# Altium footprint library Connectors_THT.PcbLib: 103 footprints (part 9 of 11)
Each footprint in its own frame and in the unit in brackets; x right, y up, seen from the top. Pads: shape width x height; smd on the part's side, far side on the other; paste and mask are expansions set on the pad; w line width, h text height; cw(c..) or ccw(c..) is an arc to the next point about the centre after c.
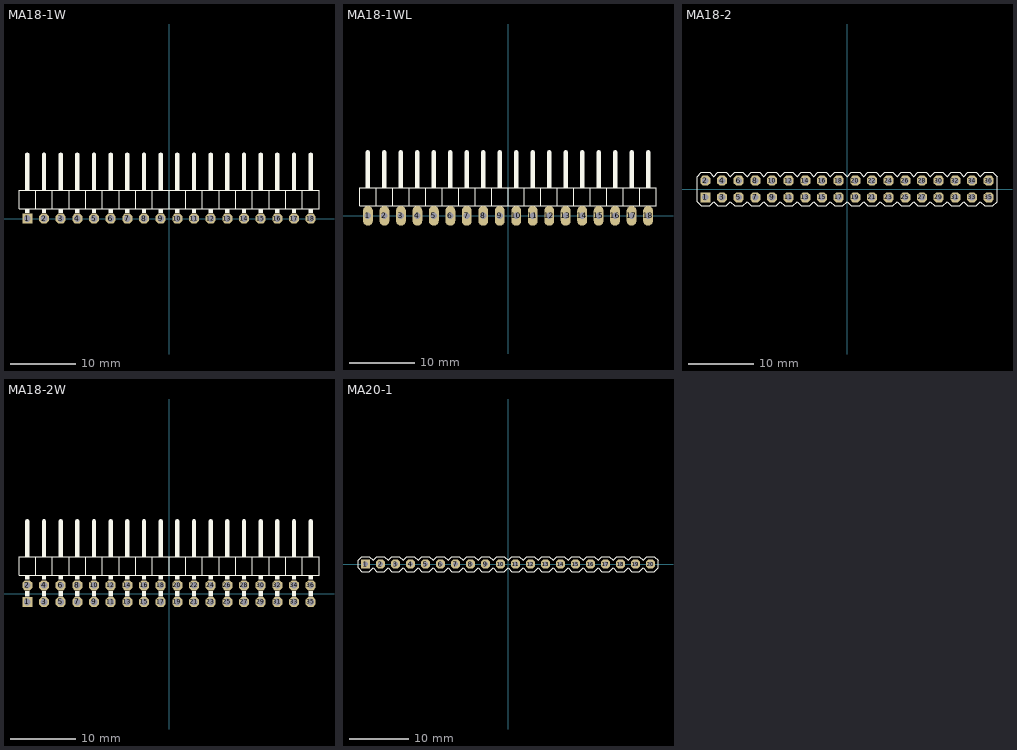
[diagram p8: the footprints below, top view; thin cyan lines are the x and y axes]

## MA18-1W [mil]
pads (18):
  rect 60x60 hole 40: 1(-850,0)
  oct 60x60 hole 40: 2(-750,0) 3(-650,0) 4(-550,0) 5(-450,0) 6(-350,0) 7(-250,0) 8(-150,0) 9(-50,0) 10(50,0) 11(150,0) 12(250,0) 13(350,0) 14(450,0) 15(550,0) 16(650,0) 17(750,0) 18(850,0)
Top Overlay:
  rectangle: 637,170 663,200
  rectangle: 737,170 763,200
  rectangle: 837,170 863,200
  rectangle: 137,170 163,200
  rectangle: 237,170 263,200
  rectangle: 337,170 363,200
  rectangle: 437,170 463,200
  rectangle: 537,170 563,200
  rectangle: -363,170 -337,200
  rectangle: -263,170 -237,200
  rectangle: -163,170 -137,200
  rectangle: -63,170 -37,200
  rectangle: 37,170 63,200
  rectangle: -863,170 -837,200
  rectangle: -763,170 -737,200
  rectangle: -663,170 -637,200
  rectangle: -563,170 -537,200
  rectangle: -463,170 -437,200
  rectangle: 737,34 763,60
  rectangle: 837,34 863,60
  rectangle: 637,34 663,60
  rectangle: 537,34 563,60
  rectangle: 437,34 463,60
  rectangle: 337,34 363,60
  rectangle: 237,34 263,60
  rectangle: 137,34 163,60
  rectangle: 37,34 63,60
  rectangle: -63,34 -37,60
  rectangle: -163,34 -137,60
  rectangle: -263,34 -237,60
  rectangle: -363,34 -337,60
  rectangle: -463,34 -437,60
  rectangle: -563,34 -537,60
  rectangle: -663,34 -637,60
  rectangle: -763,34 -737,60
  rectangle: -863,34 -837,60
  lines w6: -800,60 -800,170 ; -800,60 -900,60 -900,170 -800,170 ; -800,60 -700,60 ; -800,170 -700,170 ; -700,60 -600,60 ; -700,60 -700,170 ; -700,170 -600,170 ; -600,60 -500,60 ; -600,60 -600,170 ; -600,170 -500,170 ; -500,60 -400,60 ; -500,60 -500,170 ; -500,170 -400,170 ; -400,60 -300,60 ; -400,60 -400,170 ; -400,170 -300,170 ; -300,60 -300,170 ; -300,60 -200,60 ; -300,170 -200,170 ; -200,60 -100,60 ; -200,60 -200,170 ; -200,170 -100,170 ; -100,60 0,60 ; -100,60 -100,170 ; -100,170 0,170 ; 0,60 100,60 ; 0,60 0,170 ; 0,170 100,170 ; 100,60 200,60 ; 100,60 100,170 ; 100,170 200,170 ; 200,60 200,170 ; 200,60 300,60 ; 200,170 300,170 ; 300,60 400,60 ; 300,60 300,170 ; 300,170 400,170 ; 400,60 500,60 ; 400,60 400,170 ; 400,170 500,170 ; 500,60 600,60 ; 500,60 500,170 ; 500,170 600,170 ; 600,60 700,60 ; 600,60 600,170 ; 600,170 700,170 ; 700,60 700,170 ; 700,60 800,60 ; 700,170 800,170 ; 800,60 900,60 900,170 800,170 ; 800,60 800,170
  lines w26: -850,200 -850,385 ; -750,200 -750,385 ; -650,200 -650,385 ; -550,200 -550,385 ; -450,200 -450,385 ; -350,200 -350,385 ; -250,200 -250,385 ; -150,200 -150,385 ; -50,200 -50,385 ; 50,200 50,385 ; 150,200 150,385 ; 250,200 250,385 ; 350,200 350,385 ; 450,200 450,385 ; 550,200 550,385 ; 650,200 650,385 ; 750,200 750,385 ; 850,200 850,385
3D body: height 62.48, standoff 0, extent 837.51,-12.49 862.51,12.51
3D body: height 100, standoff 0, extent 800,60 900,170
3D body: height 62.5, standoff 37.5, extent 837.51,-12.49 862.51,393.76
3D body: height 62.48, standoff 0, extent 737.51,-12.49 762.51,12.51
3D body: height 100, standoff 0, extent 700,60 800,170
3D body: height 62.5, standoff 37.5, extent 737.51,-12.49 762.51,393.76
3D body: height 62.5, standoff 37.5, extent 637.5,-12.49 662.5,393.75
3D body: height 100, standoff 0, extent 600,60 700,170
3D body: height 62.48, standoff 0, extent 637.51,-12.49 662.51,12.51
3D body: height 31.5, standoff 0, extent 637.51,-12.49 662.51,12.51
3D body: height 31.5, standoff 0, extent 737.51,-12.49 762.51,12.51
3D body: height 31.5, standoff 0, extent 837.51,-12.49 862.51,12.51
3D body: height 62.48, standoff 0, extent 537.51,-12.49 562.51,12.51
3D body: height 100, standoff 0, extent 500,60 600,170
3D body: height 62.5, standoff 37.5, extent 537.51,-12.49 562.51,393.76
3D body: height 62.48, standoff 0, extent 437.51,-12.49 462.51,12.51
3D body: height 100, standoff 0, extent 400,60 500,170
3D body: height 62.5, standoff 37.5, extent 437.51,-12.49 462.51,393.76
3D body: height 62.48, standoff 0, extent 337.51,-12.49 362.51,12.51
3D body: height 100, standoff 0, extent 300,60 400,170
3D body: height 62.5, standoff 37.5, extent 337.51,-12.49 362.51,393.76
3D body: height 62.48, standoff 0, extent 237.51,-12.49 262.51,12.51
3D body: height 100, standoff 0, extent 200,60 300,170
3D body: height 62.5, standoff 37.5, extent 237.51,-12.49 262.51,393.76
3D body: height 62.5, standoff 37.5, extent 137.5,-12.49 162.5,393.75
3D body: height 100, standoff 0, extent 100,60 200,170
3D body: height 62.48, standoff 0, extent 137.51,-12.49 162.51,12.51
3D body: height 31.5, standoff 0, extent 137.51,-12.49 162.51,12.51
3D body: height 31.5, standoff 0, extent 237.51,-12.49 262.51,12.51
3D body: height 31.5, standoff 0, extent 337.51,-12.49 362.51,12.51
3D body: height 31.5, standoff 0, extent 437.51,-12.49 462.51,12.51
3D body: height 31.5, standoff 0, extent 537.51,-12.49 562.51,12.51
3D body: height 62.48, standoff 0, extent 37.51,-12.49 62.51,12.51
3D body: height 100, standoff 0, extent 0,60 100,170
3D body: height 62.5, standoff 37.5, extent 37.51,-12.49 62.51,393.76
3D body: height 62.48, standoff 0, extent -62.49,-12.49 -37.49,12.51
3D body: height 100, standoff 0, extent -100,60 0,170
3D body: height 62.5, standoff 37.5, extent -62.49,-12.49 -37.49,393.76
3D body: height 62.48, standoff 0, extent -162.49,-12.49 -137.49,12.51
3D body: height 100, standoff 0, extent -200,60 -100,170
3D body: height 62.5, standoff 37.5, extent -162.49,-12.49 -137.49,393.76
3D body: height 62.48, standoff 0, extent -262.49,-12.49 -237.49,12.51
3D body: height 100, standoff 0, extent -300,60 -200,170
3D body: height 62.5, standoff 37.5, extent -262.49,-12.49 -237.49,393.76
3D body: height 62.5, standoff 37.5, extent -362.5,-12.49 -337.5,393.75
3D body: height 100, standoff 0, extent -400,60 -300,170
3D body: height 62.48, standoff 0, extent -362.49,-12.49 -337.49,12.51
3D body: height 31.5, standoff 0, extent -362.49,-12.49 -337.49,12.51
3D body: height 31.5, standoff 0, extent -262.49,-12.49 -237.49,12.51
3D body: height 31.5, standoff 0, extent -162.49,-12.49 -137.49,12.51
3D body: height 31.5, standoff 0, extent -62.49,-12.49 -37.49,12.51
3D body: height 31.5, standoff 0, extent 37.51,-12.49 62.51,12.51
3D body: height 62.48, standoff 0, extent -462.49,-12.49 -437.49,12.51
3D body: height 100, standoff 0, extent -500,60 -400,170
3D body: height 62.5, standoff 37.5, extent -462.49,-12.49 -437.49,393.76
3D body: height 62.48, standoff 0, extent -562.49,-12.49 -537.49,12.51
3D body: height 100, standoff 0, extent -600,60 -500,170
3D body: height 62.5, standoff 37.5, extent -562.49,-12.49 -537.49,393.76
3D body: height 62.48, standoff 0, extent -662.49,-12.49 -637.49,12.51
3D body: height 100, standoff 0, extent -700,60 -600,170
3D body: height 62.5, standoff 37.5, extent -662.49,-12.49 -637.49,393.76
3D body: height 62.48, standoff 0, extent -762.49,-12.49 -737.49,12.51
3D body: height 100, standoff 0, extent -800,60 -700,170
3D body: height 62.5, standoff 37.5, extent -762.49,-12.49 -737.49,393.76
3D body: height 62.5, standoff 37.5, extent -862.5,-12.49 -837.5,393.75
3D body: height 100, standoff 0, extent -900,60 -800,170
3D body: height 62.48, standoff 0, extent -862.49,-12.49 -837.49,12.51
3D body: height 31.5, standoff 0, extent -862.49,-12.49 -837.49,12.51
3D body: height 31.5, standoff 0, extent -762.49,-12.49 -737.49,12.51
3D body: height 31.5, standoff 0, extent -662.49,-12.49 -637.49,12.51
3D body: height 31.5, standoff 0, extent -562.49,-12.49 -537.49,12.51
3D body: height 31.5, standoff 0, extent -462.49,-12.49 -437.49,12.51

## MA18-1WL [mil]
pads (18):
  oval 60x120 hole 40: 1(-850,0) 2(-750,0) 3(-650,0) 4(-550,0) 5(-450,0) 6(-350,0) 7(-250,0) 8(-150,0) 9(-50,0) 10(50,0) 11(150,0) 12(250,0) 13(350,0) 14(450,0) 15(550,0) 16(650,0) 17(750,0) 18(850,0)
Top Overlay:
  rectangle: -863,34 -837,60
  rectangle: -763,34 -737,60
  rectangle: -663,34 -637,60
  rectangle: -563,34 -537,60
  rectangle: -463,34 -437,60
  rectangle: -363,34 -337,60
  rectangle: -263,34 -237,60
  rectangle: -163,34 -137,60
  rectangle: -63,34 -37,60
  rectangle: 37,34 63,60
  rectangle: 137,34 163,60
  rectangle: 237,34 263,60
  rectangle: 337,34 363,60
  rectangle: 437,34 463,60
  rectangle: 537,34 563,60
  rectangle: 637,34 663,60
  rectangle: 837,34 863,60
  rectangle: 737,34 763,60
  rectangle: -463,170 -437,200
  rectangle: -563,170 -537,200
  rectangle: -663,170 -637,200
  rectangle: -763,170 -737,200
  rectangle: -863,170 -837,200
  rectangle: 37,170 63,200
  rectangle: -63,170 -37,200
  rectangle: -163,170 -137,200
  rectangle: -263,170 -237,200
  rectangle: -363,170 -337,200
  rectangle: 537,170 563,200
  rectangle: 437,170 463,200
  rectangle: 337,170 363,200
  rectangle: 237,170 263,200
  rectangle: 137,170 163,200
  rectangle: 837,170 863,200
  rectangle: 737,170 763,200
  rectangle: 637,170 663,200
  lines w6: -800,60 -700,60 ; -800,60 -900,60 -900,170 -800,170 ; -800,60 -800,170 ; -800,170 -700,170 ; -700,60 -700,170 ; -700,60 -600,60 ; -700,170 -600,170 ; -600,60 -600,170 ; -600,60 -500,60 ; -600,170 -500,170 ; -500,60 -500,170 ; -500,60 -400,60 ; -500,170 -400,170 ; -400,60 -400,170 ; -400,60 -300,60 ; -400,170 -300,170 ; -300,60 -200,60 ; -300,60 -300,170 ; -300,170 -200,170 ; -200,60 -200,170 ; -200,60 -100,60 ; -200,170 -100,170 ; -100,60 -100,170 ; -100,60 0,60 ; -100,170 0,170 ; 0,60 0,170 ; 0,60 100,60 ; 0,170 100,170 ; 100,60 100,170 ; 100,60 200,60 ; 100,170 200,170 ; 200,60 300,60 ; 200,60 200,170 ; 200,170 300,170 ; 300,60 300,170 ; 300,60 400,60 ; 300,170 400,170 ; 400,60 400,170 ; 400,60 500,60 ; 400,170 500,170 ; 500,60 500,170 ; 500,60 600,60 ; 500,170 600,170 ; 600,60 600,170 ; 600,60 700,60 ; 600,170 700,170 ; 700,60 800,60 ; 700,60 700,170 ; 700,170 800,170 ; 800,60 800,170 ; 800,60 900,60 900,170 800,170
  lines w26: -850,200 -850,385 ; -750,200 -750,385 ; -650,200 -650,385 ; -550,200 -550,385 ; -450,200 -450,385 ; -350,200 -350,385 ; -250,200 -250,385 ; -150,200 -150,385 ; -50,200 -50,385 ; 50,200 50,385 ; 150,200 150,385 ; 250,200 250,385 ; 350,200 350,385 ; 450,200 450,385 ; 550,200 550,385 ; 650,200 650,385 ; 750,200 750,385 ; 850,200 850,385
3D body: height 31.5, standoff 0, extent -462.49,-12.49 -437.49,12.51
3D body: height 31.5, standoff 0, extent -562.49,-12.49 -537.49,12.51
3D body: height 31.5, standoff 0, extent -662.49,-12.49 -637.49,12.51
3D body: height 31.5, standoff 0, extent -762.49,-12.49 -737.49,12.51
3D body: height 31.5, standoff 0, extent -862.49,-12.49 -837.49,12.51
3D body: height 62.48, standoff 0, extent -862.49,-12.49 -837.49,12.51
3D body: height 100, standoff 0, extent -900,60 -800,170
3D body: height 62.5, standoff 37.5, extent -862.5,-12.49 -837.5,393.75
3D body: height 62.5, standoff 37.5, extent -762.49,-12.49 -737.49,393.76
3D body: height 100, standoff 0, extent -800,60 -700,170
3D body: height 62.48, standoff 0, extent -762.49,-12.49 -737.49,12.51
3D body: height 62.5, standoff 37.5, extent -662.49,-12.49 -637.49,393.76
3D body: height 100, standoff 0, extent -700,60 -600,170
3D body: height 62.48, standoff 0, extent -662.49,-12.49 -637.49,12.51
3D body: height 62.5, standoff 37.5, extent -562.49,-12.49 -537.49,393.76
3D body: height 100, standoff 0, extent -600,60 -500,170
3D body: height 62.48, standoff 0, extent -562.49,-12.49 -537.49,12.51
3D body: height 62.5, standoff 37.5, extent -462.49,-12.49 -437.49,393.76
3D body: height 100, standoff 0, extent -500,60 -400,170
3D body: height 62.48, standoff 0, extent -462.49,-12.49 -437.49,12.51
3D body: height 31.5, standoff 0, extent 37.51,-12.49 62.51,12.51
3D body: height 31.5, standoff 0, extent -62.49,-12.49 -37.49,12.51
3D body: height 31.5, standoff 0, extent -162.49,-12.49 -137.49,12.51
3D body: height 31.5, standoff 0, extent -262.49,-12.49 -237.49,12.51
3D body: height 31.5, standoff 0, extent -362.49,-12.49 -337.49,12.51
3D body: height 62.48, standoff 0, extent -362.49,-12.49 -337.49,12.51
3D body: height 100, standoff 0, extent -400,60 -300,170
3D body: height 62.5, standoff 37.5, extent -362.5,-12.49 -337.5,393.75
3D body: height 62.5, standoff 37.5, extent -262.49,-12.49 -237.49,393.76
3D body: height 100, standoff 0, extent -300,60 -200,170
3D body: height 62.48, standoff 0, extent -262.49,-12.49 -237.49,12.51
3D body: height 62.5, standoff 37.5, extent -162.49,-12.49 -137.49,393.76
3D body: height 100, standoff 0, extent -200,60 -100,170
3D body: height 62.48, standoff 0, extent -162.49,-12.49 -137.49,12.51
3D body: height 62.5, standoff 37.5, extent -62.49,-12.49 -37.49,393.76
3D body: height 100, standoff 0, extent -100,60 0,170
3D body: height 62.48, standoff 0, extent -62.49,-12.49 -37.49,12.51
3D body: height 62.5, standoff 37.5, extent 37.51,-12.49 62.51,393.76
3D body: height 100, standoff 0, extent 0,60 100,170
3D body: height 62.48, standoff 0, extent 37.51,-12.49 62.51,12.51
3D body: height 31.5, standoff 0, extent 537.51,-12.49 562.51,12.51
3D body: height 31.5, standoff 0, extent 437.51,-12.49 462.51,12.51
3D body: height 31.5, standoff 0, extent 337.51,-12.49 362.51,12.51
3D body: height 31.5, standoff 0, extent 237.51,-12.49 262.51,12.51
3D body: height 31.5, standoff 0, extent 137.51,-12.49 162.51,12.51
3D body: height 62.48, standoff 0, extent 137.51,-12.49 162.51,12.51
3D body: height 100, standoff 0, extent 100,60 200,170
3D body: height 62.5, standoff 37.5, extent 137.5,-12.49 162.5,393.75
3D body: height 62.5, standoff 37.5, extent 237.51,-12.49 262.51,393.76
3D body: height 100, standoff 0, extent 200,60 300,170
3D body: height 62.48, standoff 0, extent 237.51,-12.49 262.51,12.51
3D body: height 62.5, standoff 37.5, extent 337.51,-12.49 362.51,393.76
3D body: height 100, standoff 0, extent 300,60 400,170
3D body: height 62.48, standoff 0, extent 337.51,-12.49 362.51,12.51
3D body: height 62.5, standoff 37.5, extent 437.51,-12.49 462.51,393.76
3D body: height 100, standoff 0, extent 400,60 500,170
3D body: height 62.48, standoff 0, extent 437.51,-12.49 462.51,12.51
3D body: height 62.5, standoff 37.5, extent 537.51,-12.49 562.51,393.76
3D body: height 100, standoff 0, extent 500,60 600,170
3D body: height 62.48, standoff 0, extent 537.51,-12.49 562.51,12.51
3D body: height 31.5, standoff 0, extent 837.51,-12.49 862.51,12.51
3D body: height 31.5, standoff 0, extent 737.51,-12.49 762.51,12.51
3D body: height 31.5, standoff 0, extent 637.51,-12.49 662.51,12.51
3D body: height 62.48, standoff 0, extent 637.51,-12.49 662.51,12.51
3D body: height 100, standoff 0, extent 600,60 700,170
3D body: height 62.5, standoff 37.5, extent 637.5,-12.49 662.5,393.75
3D body: height 62.5, standoff 37.5, extent 737.51,-12.49 762.51,393.76
3D body: height 100, standoff 0, extent 700,60 800,170
3D body: height 62.48, standoff 0, extent 737.51,-12.49 762.51,12.51
3D body: height 62.5, standoff 37.5, extent 837.51,-12.49 862.51,393.76
3D body: height 100, standoff 0, extent 800,60 900,170
3D body: height 62.48, standoff 0, extent 837.51,-12.49 862.51,12.51

## MA18-2 [mil]
pads (36):
  rect 60x60 hole 40: 1(-850,-50)
  oct 60x60 hole 40: 2(-850,50) 3(-750,-50) 4(-750,50) 5(-650,-50) 6(-650,50) 7(-550,-50) 8(-550,50) 9(-450,-50) 10(-450,50) 11(-350,-50) 12(-350,50) 13(-250,-50) 14(-250,50) 15(-150,-50) 16(-150,50) 17(-50,-50) 18(-50,50) 19(50,-50) 20(50,50) 21(150,-50) 22(150,50) 23(250,-50) 24(250,50) 25(350,-50) 26(350,50) 27(450,-50) 28(450,50) 29(550,-50) 30(550,50) 31(650,-50) 32(650,50) 33(750,-50) 34(750,50) 35(850,-50) 36(850,50)
Top Overlay:
  lines w6: -900,-75 -875,-100 -825,-100 -800,-75 -775,-100 -725,-100 -700,-75 -675,-100 -625,-100 -600,-75 -575,-100 -525,-100 -500,-75 -475,-100 -425,-100 -400,-75 -375,-100 -325,-100 -300,-75 -275,-100 -225,-100 -200,-75 -175,-100 -125,-100 -100,-75 -75,-100 -25,-100 0,-75 25,-100 75,-100 100,-75 125,-100 175,-100 200,-75 225,-100 275,-100 300,-75 325,-100 375,-100 400,-75 425,-100 475,-100 500,-75 525,-100 575,-100 600,-75 625,-100 675,-100 700,-75 725,-100 775,-100 800,-75 825,-100 875,-100 900,-75 900,75 875,100 825,100 800,75 775,100 725,100 700,75 675,100 625,100 600,75 575,100 525,100 500,75 475,100 425,100 400,75 375,100 325,100 300,75 275,100 225,100 200,75 175,100 125,100 100,75 75,100 25,100 0,75 -25,100 -75,100 -100,75 -125,100 -175,100 -200,75 -225,100 -275,100 -300,75 -325,100 -375,100 -400,75 -425,100 -475,100 -500,75 -525,100 -575,100 -600,75 -625,100 -675,100 -700,75 -725,100 -775,100 -800,75 -825,100 -875,100 -900,75 -900,-75
3D body: height 31.5, standoff 0, extent -262.49,37.51 -237.49,62.51
3D body: height 338.58, standoff 0, extent -262.49,-62.49 -237.49,-37.49
3D body: height 11.81, standoff 0, extent -300,-100 -200,-75
3D body: height 11.81, standoff 0, extent -300,75 -200,100
3D body: height 98.43, standoff 11.81, extent -300,-100 -200,100
3D body: height 338.58, standoff 0, extent -262.49,37.51 -237.49,62.51
3D body: height 31.5, standoff 0, extent -262.49,-62.49 -237.49,-37.49
3D body: height 31.5, standoff 0, extent -362.49,37.51 -337.49,62.51
3D body: height 338.58, standoff 0, extent -362.49,-62.49 -337.49,-37.49
3D body: height 11.81, standoff 0, extent -400,-100 -300,-75
3D body: height 11.81, standoff 0, extent -400,75 -300,100
3D body: height 98.43, standoff 11.81, extent -400,-100 -300,100
3D body: height 338.58, standoff 0, extent -362.49,37.51 -337.49,62.51
3D body: height 31.5, standoff 0, extent -362.49,-62.49 -337.49,-37.49
3D body: height 31.5, standoff 0, extent -462.49,37.51 -437.49,62.51
3D body: height 338.58, standoff 0, extent -462.49,-62.49 -437.49,-37.49
3D body: height 11.81, standoff 0, extent -500,-100 -400,-75
3D body: height 11.81, standoff 0, extent -500,75 -400,100
3D body: height 98.43, standoff 11.81, extent -500,-100 -400,100
3D body: height 338.58, standoff 0, extent -462.49,37.51 -437.49,62.51
3D body: height 31.5, standoff 0, extent -462.49,-62.49 -437.49,-37.49
3D body: height 31.5, standoff 0, extent -562.49,37.51 -537.49,62.51
3D body: height 338.58, standoff 0, extent -562.49,-62.49 -537.49,-37.49
3D body: height 11.81, standoff 0, extent -600,-100 -500,-75
3D body: height 11.81, standoff 0, extent -600,75 -500,100
3D body: height 98.43, standoff 11.81, extent -600,-100 -500,100
3D body: height 338.58, standoff 0, extent -562.49,37.51 -537.49,62.51
3D body: height 31.5, standoff 0, extent -562.49,-62.49 -537.49,-37.49
3D body: height 31.5, standoff 0, extent -662.49,37.51 -637.49,62.51
3D body: height 338.58, standoff 0, extent -662.49,-62.49 -637.49,-37.49
3D body: height 11.81, standoff 0, extent -700,-100 -600,-75
3D body: height 11.81, standoff 0, extent -700,75 -600,100
3D body: height 98.43, standoff 11.81, extent -700,-100 -600,100
3D body: height 338.58, standoff 0, extent -662.49,37.51 -637.49,62.51
3D body: height 31.5, standoff 0, extent -662.49,-62.49 -637.49,-37.49
3D body: height 31.5, standoff 0, extent -762.49,37.51 -737.49,62.51
3D body: height 338.58, standoff 0, extent -762.49,-62.49 -737.49,-37.49
3D body: height 11.81, standoff 0, extent -800,-100 -700,-75
3D body: height 11.81, standoff 0, extent -800,75 -700,100
3D body: height 98.43, standoff 11.81, extent -800,-100 -700,100
3D body: height 338.58, standoff 0, extent -762.49,37.51 -737.49,62.51
3D body: height 31.5, standoff 0, extent -762.49,-62.49 -737.49,-37.49
3D body: height 31.5, standoff 0, extent -862.49,37.51 -837.49,62.51
3D body: height 338.58, standoff 0, extent -862.49,-62.49 -837.49,-37.49
3D body: height 11.81, standoff 0, extent -900,-100 -800,-75
3D body: height 11.81, standoff 0, extent -900,75 -800,100
3D body: height 98.43, standoff 11.81, extent -900,-100 -800,100
3D body: height 338.58, standoff 0, extent -862.49,37.51 -837.49,62.51
3D body: height 31.5, standoff 0, extent -862.49,-62.49 -837.49,-37.49
3D body: height 31.5, standoff 0, extent 437.51,37.51 462.51,62.51
3D body: height 338.58, standoff 0, extent 437.51,-62.49 462.51,-37.49
3D body: height 11.81, standoff 0, extent 400,-100 500,-75
3D body: height 11.81, standoff 0, extent 400,75 500,100
3D body: height 98.43, standoff 11.81, extent 400,-100 500,100
3D body: height 338.58, standoff 0, extent 437.51,37.51 462.51,62.51
3D body: height 31.5, standoff 0, extent 437.51,-62.49 462.51,-37.49
3D body: height 31.5, standoff 0, extent 337.51,37.51 362.51,62.51
3D body: height 338.58, standoff 0, extent 337.51,-62.49 362.51,-37.49
3D body: height 11.81, standoff 0, extent 300,-100 400,-75
3D body: height 11.81, standoff 0, extent 300,75 400,100
3D body: height 98.43, standoff 11.81, extent 300,-100 400,100
3D body: height 338.58, standoff 0, extent 337.51,37.51 362.51,62.51
3D body: height 31.5, standoff 0, extent 337.51,-62.49 362.51,-37.49
3D body: height 31.5, standoff 0, extent 237.51,37.51 262.51,62.51
3D body: height 338.58, standoff 0, extent 237.51,-62.49 262.51,-37.49
3D body: height 11.81, standoff 0, extent 200,-100 300,-75
3D body: height 11.81, standoff 0, extent 200,75 300,100
3D body: height 98.43, standoff 11.81, extent 200,-100 300,100
3D body: height 338.58, standoff 0, extent 237.51,37.51 262.51,62.51
3D body: height 31.5, standoff 0, extent 237.51,-62.49 262.51,-37.49
3D body: height 31.5, standoff 0, extent 137.51,37.51 162.51,62.51
3D body: height 338.58, standoff 0, extent 137.51,-62.49 162.51,-37.49
3D body: height 11.81, standoff 0, extent 100,-100 200,-75
3D body: height 11.81, standoff 0, extent 100,75 200,100
3D body: height 98.43, standoff 11.81, extent 100,-100 200,100
3D body: height 338.58, standoff 0, extent 137.51,37.51 162.51,62.51
3D body: height 31.5, standoff 0, extent 137.51,-62.49 162.51,-37.49
3D body: height 31.5, standoff 0, extent 37.51,37.51 62.51,62.51
3D body: height 338.58, standoff 0, extent 37.51,-62.49 62.51,-37.49
3D body: height 11.81, standoff 0, extent 0,-100 100,-75
3D body: height 11.81, standoff 0, extent 0,75 100,100
3D body: height 98.43, standoff 11.81, extent 0,-100 100,100
3D body: height 338.58, standoff 0, extent 37.51,37.51 62.51,62.51
3D body: height 31.5, standoff 0, extent 37.51,-62.49 62.51,-37.49
3D body: height 31.5, standoff 0, extent -62.49,37.51 -37.49,62.51
3D body: height 338.58, standoff 0, extent -62.49,-62.49 -37.49,-37.49
3D body: height 11.81, standoff 0, extent -100,-100 0,-75
3D body: height 11.81, standoff 0, extent -100,75 0,100
3D body: height 98.43, standoff 11.81, extent -100,-100 0,100
3D body: height 338.58, standoff 0, extent -62.49,37.51 -37.49,62.51
3D body: height 31.5, standoff 0, extent -62.49,-62.49 -37.49,-37.49
3D body: height 31.5, standoff 0, extent -162.49,37.51 -137.49,62.51
3D body: height 338.58, standoff 0, extent -162.49,-62.49 -137.49,-37.49
3D body: height 11.81, standoff 0, extent -200,-100 -100,-75
3D body: height 11.81, standoff 0, extent -200,75 -100,100
3D body: height 98.43, standoff 11.81, extent -200,-100 -100,100
3D body: height 338.58, standoff 0, extent -162.49,37.51 -137.49,62.51
3D body: height 31.5, standoff 0, extent -162.49,-62.49 -137.49,-37.49
3D body: height 31.5, standoff 0, extent 837.51,37.51 862.51,62.51
3D body: height 338.58, standoff 0, extent 837.51,-62.49 862.51,-37.49
3D body: height 11.81, standoff 0, extent 800,-100 900,-75
3D body: height 11.81, standoff 0, extent 800,75 900,100
3D body: height 98.43, standoff 11.81, extent 800,-100 900,100
3D body: height 338.58, standoff 0, extent 837.51,37.51 862.51,62.51
3D body: height 31.5, standoff 0, extent 837.51,-62.49 862.51,-37.49
3D body: height 31.5, standoff 0, extent 737.51,37.51 762.51,62.51
3D body: height 338.58, standoff 0, extent 737.51,-62.49 762.51,-37.49
3D body: height 11.81, standoff 0, extent 700,-100 800,-75
3D body: height 11.81, standoff 0, extent 700,75 800,100
3D body: height 98.43, standoff 11.81, extent 700,-100 800,100
3D body: height 338.58, standoff 0, extent 737.51,37.51 762.51,62.51
3D body: height 31.5, standoff 0, extent 737.51,-62.49 762.51,-37.49
3D body: height 31.5, standoff 0, extent 637.51,37.51 662.51,62.51
3D body: height 338.58, standoff 0, extent 637.51,-62.49 662.51,-37.49
3D body: height 11.81, standoff 0, extent 600,-100 700,-75
3D body: height 11.81, standoff 0, extent 600,75 700,100
3D body: height 98.43, standoff 11.81, extent 600,-100 700,100
3D body: height 338.58, standoff 0, extent 637.51,37.51 662.51,62.51
3D body: height 31.5, standoff 0, extent 637.51,-62.49 662.51,-37.49
3D body: height 31.5, standoff 0, extent 537.51,37.51 562.51,62.51
3D body: height 338.58, standoff 0, extent 537.51,-62.49 562.51,-37.49
3D body: height 11.81, standoff 0, extent 500,-100 600,-75
3D body: height 11.81, standoff 0, extent 500,75 600,100
3D body: height 98.43, standoff 11.81, extent 500,-100 600,100
3D body: height 338.58, standoff 0, extent 537.51,37.51 562.51,62.51
3D body: height 31.5, standoff 0, extent 537.51,-62.49 562.51,-37.49

## MA18-2W [mil]
pads (36):
  rect 60x60 hole 40: 1(-850,-50)
  oct 60x60 hole 40: 2(-850,50) 3(-750,-50) 4(-750,50) 5(-650,-50) 6(-650,50) 7(-550,-50) 8(-550,50) 9(-450,-50) 10(-450,50) 11(-350,-50) 12(-350,50) 13(-250,-50) 14(-250,50) 15(-150,-50) 16(-150,50) 17(-50,-50) 18(-50,50) 19(50,-50) 20(50,50) 21(150,-50) 22(150,50) 23(250,-50) 24(250,50) 25(350,-50) 26(350,50) 27(450,-50) 28(450,50) 29(550,-50) 30(550,50) 31(650,-50) 32(650,50) 33(750,-50) 34(750,50) 35(850,-50) 36(850,50)
Top Overlay:
  rectangle: 637,220 663,250
  rectangle: 737,220 763,250
  rectangle: 137,220 163,250
  rectangle: 237,220 263,250
  rectangle: 337,220 363,250
  rectangle: 437,220 463,250
  rectangle: 537,220 563,250
  rectangle: -363,220 -337,250
  rectangle: -263,220 -237,250
  rectangle: -163,220 -137,250
  rectangle: -63,220 -37,250
  rectangle: 37,220 63,250
  rectangle: -863,220 -837,250
  rectangle: -763,220 -737,250
  rectangle: -663,220 -637,250
  rectangle: -563,220 -537,250
  rectangle: -463,220 -437,250
  rectangle: 737,84 763,110
  rectangle: 637,84 663,110
  rectangle: 537,84 563,110
  rectangle: 437,84 463,110
  rectangle: 337,84 363,110
  rectangle: 237,84 263,110
  rectangle: 137,84 163,110
  rectangle: 37,84 63,110
  rectangle: -63,84 -37,110
  rectangle: -163,84 -137,110
  rectangle: -263,84 -237,110
  rectangle: -363,84 -337,110
  rectangle: -463,84 -437,110
  rectangle: -563,84 -537,110
  rectangle: -663,84 -637,110
  rectangle: -763,84 -737,110
  rectangle: -863,84 -837,110
  rectangle: -863,-16 -837,16
  rectangle: -763,-16 -737,16
  rectangle: -663,-16 -637,16
  rectangle: -563,-16 -537,16
  rectangle: -463,-16 -437,16
  rectangle: -363,-16 -337,16
  rectangle: -263,-16 -237,16
  rectangle: -163,-16 -137,16
  rectangle: -63,-16 -37,16
  rectangle: 37,-16 63,16
  rectangle: 137,-16 163,16
  rectangle: 237,-16 263,16
  rectangle: 337,-16 363,16
  rectangle: 437,-16 463,16
  rectangle: 537,-16 563,16
  rectangle: 637,-16 663,16
  rectangle: 737,-16 763,16
  rectangle: 837,-16 863,16
  rectangle: 837,84 863,110
  rectangle: 837,220 863,250
  lines w6: -800,110 -800,220 ; -800,110 -900,110 -900,220 -800,220 ; -800,110 -700,110 ; -800,220 -700,220 ; -700,110 -600,110 ; -700,110 -700,220 ; -700,220 -600,220 ; -600,110 -500,110 ; -600,110 -600,220 ; -600,220 -500,220 ; -500,110 -400,110 ; -500,110 -500,220 ; -500,220 -400,220 ; -400,110 -300,110 ; -400,110 -400,220 ; -400,220 -300,220 ; -300,110 -300,220 ; -300,110 -200,110 ; -300,220 -200,220 ; -200,110 -100,110 ; -200,110 -200,220 ; -200,220 -100,220 ; -100,110 0,110 ; -100,110 -100,220 ; -100,220 0,220 ; 0,110 100,110 ; 0,110 0,220 ; 0,220 100,220 ; 100,110 200,110 ; 100,110 100,220 ; 100,220 200,220 ; 200,110 200,220 ; 200,110 300,110 ; 200,220 300,220 ; 300,110 400,110 ; 300,110 300,220 ; 300,220 400,220 ; 400,110 500,110 ; 400,110 400,220 ; 400,220 500,220 ; 500,110 600,110 ; 500,110 500,220 ; 500,220 600,220 ; 600,110 700,110 ; 600,110 600,220 ; 600,220 700,220 ; 700,110 700,220 ; 700,110 800,110 ; 700,220 800,220 ; 800,110 800,220 ; 800,110 900,110 900,220 800,220
  lines w26: -850,250 -850,435 ; -750,250 -750,435 ; -650,250 -650,435 ; -550,250 -550,435 ; -450,250 -450,435 ; -350,250 -350,435 ; -250,250 -250,435 ; -150,250 -150,435 ; -50,250 -50,435 ; 50,250 50,435 ; 150,250 150,435 ; 250,250 250,435 ; 350,250 350,435 ; 450,250 450,435 ; 550,250 550,435 ; 650,250 650,435 ; 750,250 750,435 ; 850,250 850,435
3D body: height 162.48, standoff 137.52, extent 837.5,-62.49 862.5,443.76
3D body: height 162.48, standoff 0, extent 837.51,-62.49 862.51,-37.49
3D body: height 62.48, standoff 0, extent 837.51,37.51 862.51,62.51
3D body: height 200, standoff 0, extent 800,110 900,220
3D body: height 62.5, standoff 37.5, extent 837.51,37.51 862.51,443.76
3D body: height 162.48, standoff 137.52, extent 737.5,-62.49 762.5,443.76
3D body: height 162.48, standoff 0, extent 737.51,-62.49 762.51,-37.49
3D body: height 62.48, standoff 0, extent 737.51,37.51 762.51,62.51
3D body: height 200, standoff 0, extent 700,110 800,220
3D body: height 62.5, standoff 37.5, extent 737.51,37.51 762.51,443.76
3D body: height 62.5, standoff 37.5, extent 637.5,37.51 662.5,443.75
3D body: height 200, standoff 0, extent 600,110 700,220
3D body: height 62.48, standoff 0, extent 637.51,37.51 662.51,62.51
3D body: height 162.48, standoff 0, extent 637.5,-62.5 662.5,-37.5
3D body: height 162.48, standoff 137.52, extent 637.5,-62.5 662.5,443.75
3D body: height 31.5, standoff 0, extent 637.51,37.5 662.51,62.5
3D body: height 31.5, standoff 0, extent 637.5,-62.5 662.5,-37.5
3D body: height 31.5, standoff 0, extent 737.51,37.51 762.51,62.51
3D body: height 31.5, standoff 0, extent 737.51,-62.49 762.51,-37.49
3D body: height 31.5, standoff 0, extent 837.51,-62.49 862.51,-37.49
3D body: height 31.5, standoff 0, extent 837.51,37.51 862.51,62.51
3D body: height 162.48, standoff 137.52, extent 537.5,-62.49 562.5,443.76
3D body: height 162.48, standoff 0, extent 537.51,-62.49 562.51,-37.49
3D body: height 62.48, standoff 0, extent 537.51,37.51 562.51,62.51
3D body: height 200, standoff 0, extent 500,110 600,220
3D body: height 62.5, standoff 37.5, extent 537.51,37.51 562.51,443.76
3D body: height 162.48, standoff 137.52, extent 437.5,-62.49 462.5,443.76
3D body: height 162.48, standoff 0, extent 437.51,-62.49 462.51,-37.49
3D body: height 62.48, standoff 0, extent 437.51,37.51 462.51,62.51
3D body: height 200, standoff 0, extent 400,110 500,220
3D body: height 62.5, standoff 37.5, extent 437.51,37.51 462.51,443.76
3D body: height 162.48, standoff 137.52, extent 337.5,-62.49 362.5,443.76
3D body: height 162.48, standoff 0, extent 337.51,-62.49 362.51,-37.49
3D body: height 62.48, standoff 0, extent 337.51,37.51 362.51,62.51
3D body: height 200, standoff 0, extent 300,110 400,220
3D body: height 62.5, standoff 37.5, extent 337.51,37.51 362.51,443.76
3D body: height 162.48, standoff 137.52, extent 237.5,-62.49 262.5,443.76
3D body: height 162.48, standoff 0, extent 237.51,-62.49 262.51,-37.49
3D body: height 62.48, standoff 0, extent 237.51,37.51 262.51,62.51
3D body: height 200, standoff 0, extent 200,110 300,220
3D body: height 62.5, standoff 37.5, extent 237.51,37.51 262.51,443.76
3D body: height 62.5, standoff 37.5, extent 137.5,37.51 162.5,443.75
3D body: height 200, standoff 0, extent 100,110 200,220
3D body: height 62.48, standoff 0, extent 137.51,37.51 162.51,62.51
3D body: height 162.48, standoff 0, extent 137.5,-62.5 162.5,-37.5
3D body: height 162.48, standoff 137.52, extent 137.5,-62.5 162.5,443.75
3D body: height 31.5, standoff 0, extent 137.51,37.5 162.51,62.5
3D body: height 31.5, standoff 0, extent 137.5,-62.5 162.5,-37.5
3D body: height 31.5, standoff 0, extent 237.51,37.51 262.51,62.51
3D body: height 31.5, standoff 0, extent 237.51,-62.49 262.51,-37.49
3D body: height 31.5, standoff 0, extent 337.51,-62.49 362.51,-37.49
3D body: height 31.5, standoff 0, extent 337.51,37.51 362.51,62.51
3D body: height 31.5, standoff 0, extent 437.51,37.51 462.51,62.51
3D body: height 31.5, standoff 0, extent 437.51,-62.49 462.51,-37.49
3D body: height 31.5, standoff 0, extent 537.51,37.51 562.51,62.51
3D body: height 31.5, standoff 0, extent 537.51,-62.49 562.51,-37.49
3D body: height 162.48, standoff 137.52, extent 37.5,-62.49 62.5,443.76
3D body: height 162.48, standoff 0, extent 37.51,-62.49 62.51,-37.49
3D body: height 62.48, standoff 0, extent 37.51,37.51 62.51,62.51
3D body: height 200, standoff 0, extent 0,110 100,220
3D body: height 62.5, standoff 37.5, extent 37.51,37.51 62.51,443.76
3D body: height 162.48, standoff 137.52, extent -62.5,-62.49 -37.5,443.76
3D body: height 162.48, standoff 0, extent -62.49,-62.49 -37.49,-37.49
3D body: height 62.48, standoff 0, extent -62.49,37.51 -37.49,62.51
3D body: height 200, standoff 0, extent -100,110 0,220
3D body: height 62.5, standoff 37.5, extent -62.49,37.51 -37.49,443.76
3D body: height 162.48, standoff 137.52, extent -162.5,-62.49 -137.5,443.76
3D body: height 162.48, standoff 0, extent -162.49,-62.49 -137.49,-37.49
3D body: height 62.48, standoff 0, extent -162.49,37.51 -137.49,62.51
3D body: height 200, standoff 0, extent -200,110 -100,220
3D body: height 62.5, standoff 37.5, extent -162.49,37.51 -137.49,443.76
3D body: height 162.48, standoff 137.52, extent -262.5,-62.49 -237.5,443.76
3D body: height 162.48, standoff 0, extent -262.49,-62.49 -237.49,-37.49
3D body: height 62.48, standoff 0, extent -262.49,37.51 -237.49,62.51
3D body: height 200, standoff 0, extent -300,110 -200,220
3D body: height 62.5, standoff 37.5, extent -262.49,37.51 -237.49,443.76
3D body: height 62.5, standoff 37.5, extent -362.5,37.51 -337.5,443.75
3D body: height 200, standoff 0, extent -400,110 -300,220
3D body: height 62.48, standoff 0, extent -362.49,37.51 -337.49,62.51
3D body: height 162.48, standoff 0, extent -362.5,-62.5 -337.5,-37.5
3D body: height 162.48, standoff 137.52, extent -362.5,-62.5 -337.5,443.75
3D body: height 31.5, standoff 0, extent -362.49,37.5 -337.49,62.5
3D body: height 31.5, standoff 0, extent -362.5,-62.5 -337.5,-37.5
3D body: height 31.5, standoff 0, extent -262.49,37.51 -237.49,62.51
3D body: height 31.5, standoff 0, extent -262.49,-62.49 -237.49,-37.49
3D body: height 31.5, standoff 0, extent -162.49,-62.49 -137.49,-37.49
3D body: height 31.5, standoff 0, extent -162.49,37.51 -137.49,62.51
3D body: height 31.5, standoff 0, extent -62.49,37.51 -37.49,62.51
3D body: height 31.5, standoff 0, extent -62.49,-62.49 -37.49,-37.49
3D body: height 31.5, standoff 0, extent 37.51,37.51 62.51,62.51
3D body: height 31.5, standoff 0, extent 37.51,-62.49 62.51,-37.49
3D body: height 162.48, standoff 137.52, extent -462.5,-62.49 -437.5,443.76
3D body: height 162.48, standoff 0, extent -462.49,-62.49 -437.49,-37.49
3D body: height 62.48, standoff 0, extent -462.49,37.51 -437.49,62.51
3D body: height 200, standoff 0, extent -500,110 -400,220
3D body: height 62.5, standoff 37.5, extent -462.49,37.51 -437.49,443.76
3D body: height 162.48, standoff 137.52, extent -562.5,-62.49 -537.5,443.76
3D body: height 162.48, standoff 0, extent -562.49,-62.49 -537.49,-37.49
3D body: height 62.48, standoff 0, extent -562.49,37.51 -537.49,62.51
3D body: height 200, standoff 0, extent -600,110 -500,220
3D body: height 62.5, standoff 37.5, extent -562.49,37.51 -537.49,443.76
3D body: height 162.48, standoff 137.52, extent -662.5,-62.49 -637.5,443.76
3D body: height 162.48, standoff 0, extent -662.49,-62.49 -637.49,-37.49
3D body: height 62.48, standoff 0, extent -662.49,37.51 -637.49,62.51
3D body: height 200, standoff 0, extent -700,110 -600,220
3D body: height 62.5, standoff 37.5, extent -662.49,37.51 -637.49,443.76
3D body: height 162.48, standoff 137.52, extent -762.5,-62.49 -737.5,443.76
3D body: height 162.48, standoff 0, extent -762.49,-62.49 -737.49,-37.49
3D body: height 62.48, standoff 0, extent -762.49,37.51 -737.49,62.51
3D body: height 200, standoff 0, extent -800,110 -700,220
3D body: height 62.5, standoff 37.5, extent -762.49,37.51 -737.49,443.76
3D body: height 62.5, standoff 37.5, extent -862.5,37.51 -837.5,443.75
3D body: height 200, standoff 0, extent -900,110 -800,220
3D body: height 62.48, standoff 0, extent -862.49,37.51 -837.49,62.51
3D body: height 162.48, standoff 0, extent -862.5,-62.5 -837.5,-37.5
3D body: height 162.48, standoff 137.52, extent -862.5,-62.5 -837.5,443.75
3D body: height 31.5, standoff 0, extent -862.49,37.5 -837.49,62.5
3D body: height 31.5, standoff 0, extent -862.5,-62.5 -837.5,-37.5
3D body: height 31.5, standoff 0, extent -762.49,37.51 -737.49,62.51
3D body: height 31.5, standoff 0, extent -762.49,-62.49 -737.49,-37.49
3D body: height 31.5, standoff 0, extent -662.49,-62.49 -637.49,-37.49
3D body: height 31.5, standoff 0, extent -662.49,37.51 -637.49,62.51
3D body: height 31.5, standoff 0, extent -562.49,37.51 -537.49,62.51
3D body: height 31.5, standoff 0, extent -562.49,-62.49 -537.49,-37.49
3D body: height 31.5, standoff 0, extent -462.49,37.51 -437.49,62.51
3D body: height 31.5, standoff 0, extent -462.49,-62.49 -437.49,-37.49

## MA20-1 [mil]
pads (20):
  rect 60x60 hole 36: 1(-950,0)
  oct 60x60 hole 36: 2(-850,0) 3(-750,0) 4(-650,0) 5(-550,0) 6(-450,0) 7(-350,0) 8(-250,0) 9(-150,0) 10(-50,0) 11(50,0) 12(150,0) 13(250,0) 14(350,0) 15(450,0) 16(550,0) 17(650,0) 18(750,0) 19(850,0) 20(950,0)
Top Overlay:
  lines w6: -1000,-25 -975,-50 -925,-50 -900,-25 -875,-50 -825,-50 -800,-25 -775,-50 -725,-50 -700,-25 -675,-50 -625,-50 -600,-25 -575,-50 -525,-50 -500,-25 -475,-50 -425,-50 -400,-25 -375,-50 -325,-50 -300,-25 -275,-50 -225,-50 -200,-25 -175,-50 -125,-50 -100,-25 -75,-50 -25,-50 0,-25 25,-50 75,-50 100,-25 125,-50 175,-50 200,-25 225,-50 275,-50 300,-25 325,-50 375,-50 400,-25 425,-50 475,-50 500,-25 525,-50 575,-50 600,-25 625,-50 675,-50 700,-25 725,-50 775,-50 800,-25 825,-50 875,-50 900,-25 925,-50 975,-50 1000,-25 1000,25 975,50 925,50 900,25 875,50 825,50 800,25 775,50 725,50 700,25 675,50 625,50 600,25 575,50 525,50 500,25 475,50 425,50 400,25 375,50 325,50 300,25 275,50 225,50 200,25 175,50 125,50 100,25 75,50 25,50 0,25 -25,50 -75,50 -100,25 -125,50 -175,50 -200,25 -225,50 -275,50 -300,25 -325,50 -375,50 -400,25 -425,50 -475,50 -500,25 -525,50 -575,50 -600,25 -625,50 -675,50 -700,25 -725,50 -775,50 -800,25 -825,50 -875,50 -900,25 -925,50 -975,50 -1000,25 -1000,-25
3D body: height 31.5, standoff 0, extent 237.5,-12.5 262.5,12.5
3D body: height 11.81, standoff 0, extent 200,25 300,50
3D body: height 11.81, standoff 0, extent 200,-50 300,-25
3D body: height 98.43, standoff 11.81, extent 200,-50 300,50
3D body: height 338.58, standoff 0, extent 237.5,-12.5 262.5,12.5
3D body: height 338.58, standoff 0, extent 137.5,-12.5 162.5,12.5
3D body: height 98.43, standoff 11.81, extent 100,-50 200,50
3D body: height 11.81, standoff 0, extent 100,-50 200,-25
3D body: height 11.81, standoff 0, extent 100,25 200,50
3D body: height 31.5, standoff 0, extent 137.5,-12.5 162.5,12.5
3D body: height 338.58, standoff 0, extent 37.5,-12.5 62.5,12.5
3D body: height 98.43, standoff 11.81, extent 0,-50 100,50
3D body: height 11.81, standoff 0, extent 0,-50 100,-25
3D body: height 11.81, standoff 0, extent 0,25 100,50
3D body: height 31.5, standoff 0, extent 37.5,-12.5 62.5,12.5
3D body: height 338.58, standoff 0, extent -62.5,-12.5 -37.5,12.5
3D body: height 98.43, standoff 11.81, extent -100,-50 0,50
3D body: height 11.81, standoff 0, extent -100,-50 0,-25
3D body: height 11.81, standoff 0, extent -100,25 0,50
3D body: height 31.5, standoff 0, extent -62.5,-12.5 -37.5,12.5
3D body: height 338.58, standoff 0, extent -162.5,-12.5 -137.5,12.5
3D body: height 98.43, standoff 11.81, extent -200,-50 -100,50
3D body: height 11.81, standoff 0, extent -200,-50 -100,-25
3D body: height 11.81, standoff 0, extent -200,25 -100,50
3D body: height 31.5, standoff 0, extent -162.5,-12.5 -137.5,12.5
3D body: height 338.58, standoff 0, extent -262.5,-12.5 -237.5,12.5
3D body: height 98.43, standoff 11.81, extent -300,-50 -200,50
3D body: height 11.81, standoff 0, extent -300,-50 -200,-25
3D body: height 11.81, standoff 0, extent -300,25 -200,50
3D body: height 31.5, standoff 0, extent -262.5,-12.5 -237.5,12.5
3D body: height 338.58, standoff 0, extent -362.5,-12.5 -337.5,12.5
3D body: height 98.43, standoff 11.81, extent -400,-50 -300,50
3D body: height 11.81, standoff 0, extent -400,-50 -300,-25
3D body: height 11.81, standoff 0, extent -400,25 -300,50
3D body: height 31.5, standoff 0, extent -362.5,-12.5 -337.5,12.5
3D body: height 338.58, standoff 0, extent -462.5,-12.5 -437.5,12.5
3D body: height 98.43, standoff 11.81, extent -500,-50 -400,50
3D body: height 11.81, standoff 0, extent -500,-50 -400,-25
3D body: height 11.81, standoff 0, extent -500,25 -400,50
3D body: height 31.5, standoff 0, extent -462.5,-12.5 -437.5,12.5
3D body: height 338.58, standoff 0, extent -562.5,-12.5 -537.5,12.5
3D body: height 98.43, standoff 11.81, extent -600,-50 -500,50
3D body: height 11.81, standoff 0, extent -600,-50 -500,-25
3D body: height 11.81, standoff 0, extent -600,25 -500,50
3D body: height 31.5, standoff 0, extent -562.5,-12.5 -537.5,12.5
3D body: height 338.58, standoff 0, extent -662.5,-12.5 -637.5,12.5
3D body: height 98.43, standoff 11.81, extent -700,-50 -600,50
3D body: height 11.81, standoff 0, extent -700,-50 -600,-25
3D body: height 11.81, standoff 0, extent -700,25 -600,50
3D body: height 31.5, standoff 0, extent -662.5,-12.5 -637.5,12.5
3D body: height 338.58, standoff 0, extent -762.5,-12.5 -737.5,12.5
3D body: height 98.43, standoff 11.81, extent -800,-50 -700,50
3D body: height 11.81, standoff 0, extent -800,-50 -700,-25
3D body: height 11.81, standoff 0, extent -800,25 -700,50
3D body: height 31.5, standoff 0, extent -762.5,-12.5 -737.5,12.5
3D body: height 338.58, standoff 0, extent -862.5,-12.5 -837.5,12.5
3D body: height 98.43, standoff 11.81, extent -900,-50 -800,50
3D body: height 11.81, standoff 0, extent -900,-50 -800,-25
3D body: height 11.81, standoff 0, extent -900,25 -800,50
3D body: height 31.5, standoff 0, extent -862.5,-12.5 -837.5,12.5
3D body: height 338.58, standoff 0, extent -962.5,-12.5 -937.5,12.5
3D body: height 98.43, standoff 11.81, extent -1000,-50 -900,50
3D body: height 11.81, standoff 0, extent -1000,-50 -900,-25
3D body: height 11.81, standoff 0, extent -1000,25 -900,50
3D body: height 31.5, standoff 0, extent -962.5,-12.5 -937.5,12.5
3D body: height 31.5, standoff 0, extent 337.5,-12.5 362.5,12.5
3D body: height 11.81, standoff 0, extent 300,25 400,50
3D body: height 11.81, standoff 0, extent 300,-50 400,-25
3D body: height 98.43, standoff 11.81, extent 300,-50 400,50
3D body: height 338.58, standoff 0, extent 337.5,-12.5 362.5,12.5
3D body: height 31.5, standoff 0, extent 437.5,-12.5 462.5,12.5
3D body: height 11.81, standoff 0, extent 400,25 500,50
3D body: height 11.81, standoff 0, extent 400,-50 500,-25
3D body: height 98.43, standoff 11.81, extent 400,-50 500,50
3D body: height 338.58, standoff 0, extent 437.5,-12.5 462.5,12.5
3D body: height 31.5, standoff 0, extent 537.5,-12.5 562.5,12.5
3D body: height 11.81, standoff 0, extent 500,25 600,50
3D body: height 11.81, standoff 0, extent 500,-50 600,-25
3D body: height 98.43, standoff 11.81, extent 500,-50 600,50
3D body: height 338.58, standoff 0, extent 537.5,-12.5 562.5,12.5
3D body: height 31.5, standoff 0, extent 637.5,-12.5 662.5,12.5
3D body: height 11.81, standoff 0, extent 600,25 700,50
3D body: height 11.81, standoff 0, extent 600,-50 700,-25
3D body: height 98.43, standoff 11.81, extent 600,-50 700,50
3D body: height 338.58, standoff 0, extent 637.5,-12.5 662.5,12.5
3D body: height 31.5, standoff 0, extent 737.5,-12.5 762.5,12.5
3D body: height 11.81, standoff 0, extent 700,25 800,50
3D body: height 11.81, standoff 0, extent 700,-50 800,-25
3D body: height 98.43, standoff 11.81, extent 700,-50 800,50
3D body: height 338.58, standoff 0, extent 737.5,-12.5 762.5,12.5
3D body: height 31.5, standoff 0, extent 837.5,-12.5 862.5,12.5
3D body: height 11.81, standoff 0, extent 800,25 900,50
3D body: height 11.81, standoff 0, extent 800,-50 900,-25
3D body: height 98.43, standoff 11.81, extent 800,-50 900,50
3D body: height 338.58, standoff 0, extent 837.5,-12.5 862.5,12.5
3D body: height 338.58, standoff 0, extent 937.5,-12.5 962.5,12.5
3D body: height 98.43, standoff 11.81, extent 900,-50 1000,50
3D body: height 11.81, standoff 0, extent 900,-50 1000,-25
3D body: height 11.81, standoff 0, extent 900,25 1000,50
3D body: height 31.5, standoff 0, extent 937.5,-12.5 962.5,12.5